# Altium footprint library Connectors.PcbLib: 56 footprints (part 2 of 4)
Each footprint in its own frame and in the unit in brackets; x right, y up, seen from the top. Pads: shape width x height; smd on the part's side, far side on the other; paste and mask are expansions set on the pad; w line width, h text height; cw(c..) or ccw(c..) is an arc to the next point about the centre after c.
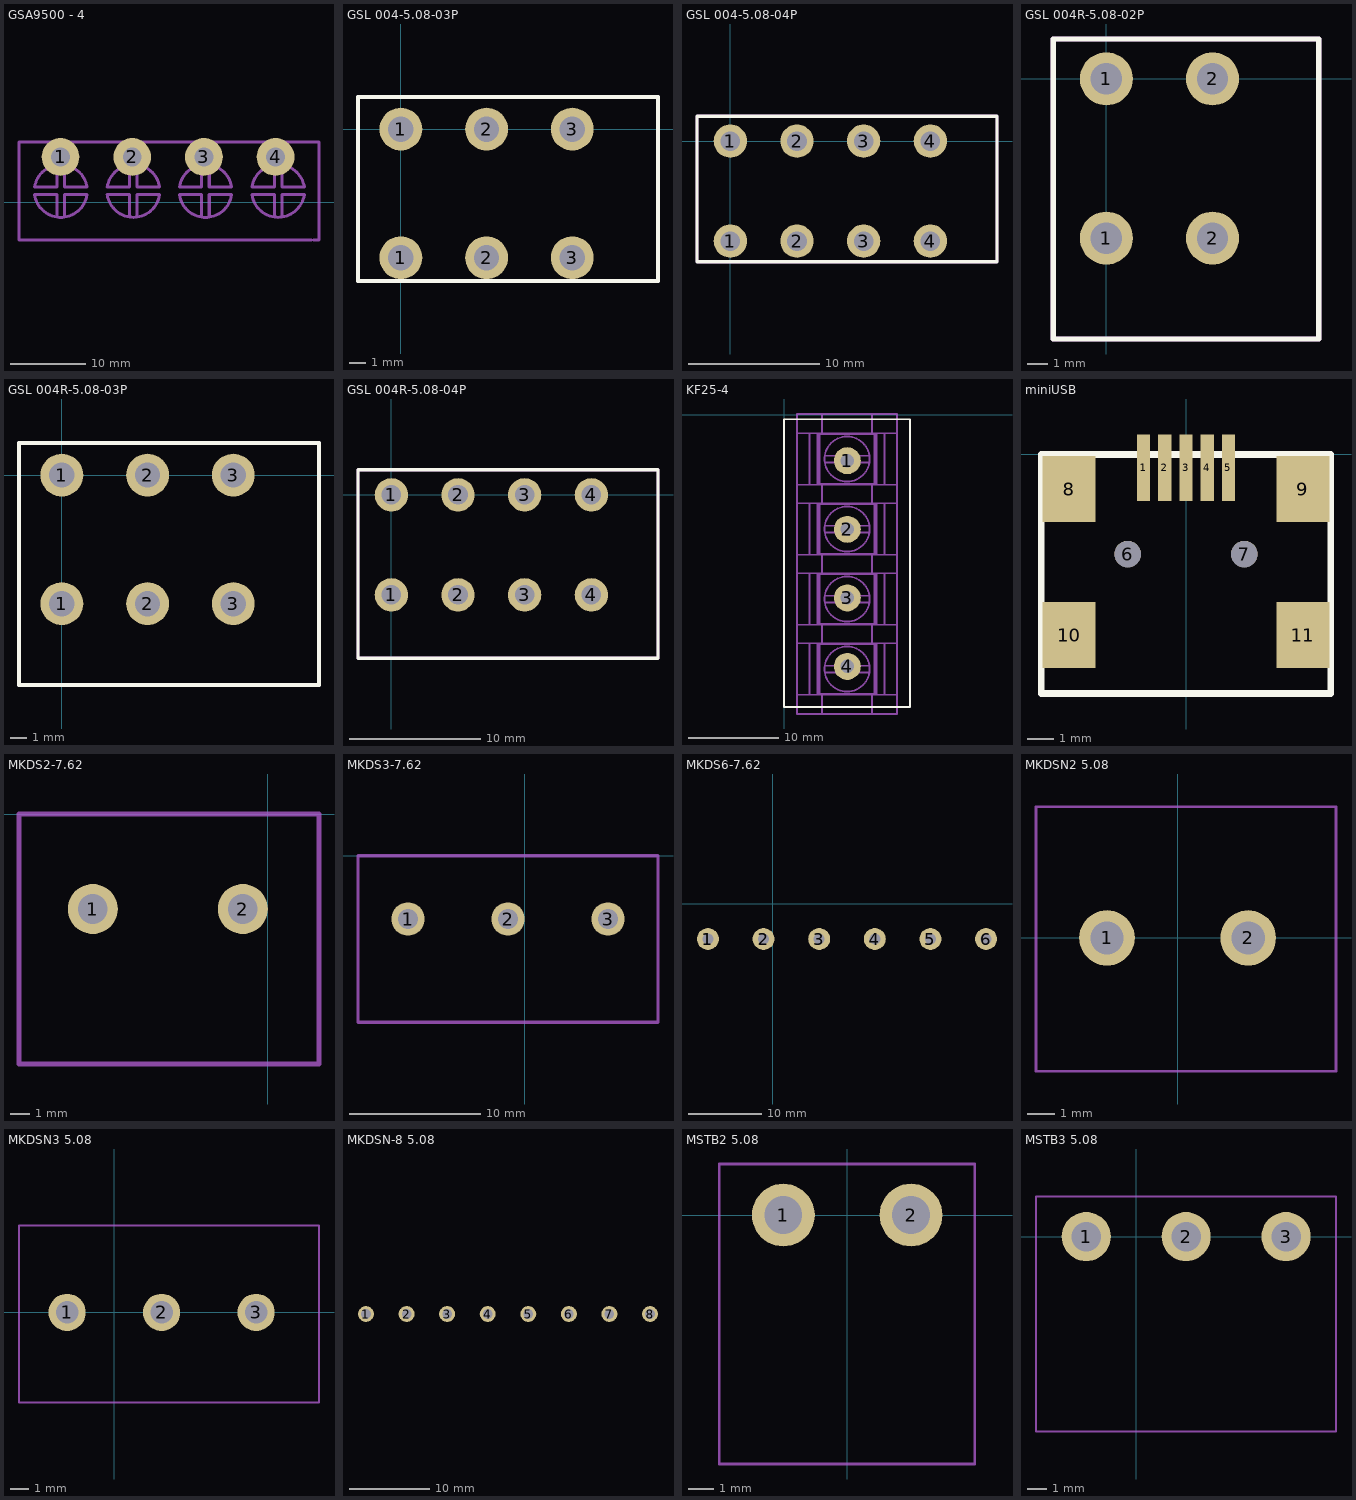
[diagram p1: the footprints below, top view; thin cyan lines are the x and y axes]

## GSA9500 - 4 [mm]
pads (4):
  round 5 hole 2.5 paste-25.4: 1(-70.5,6) 2(-61,6) 3(-51.5,6) 4(-42,6)
Mechanical 13:
  lines w0.4: -73.928,1 ccw(c-70.464,1.495) -70.97,-1.968 ccw(c-70.464,1.495) -69.97,-1.97 ccw(c-70.464,1.495) -66.999,1 ; -73.927,1 -70.97,1 -70.97,-1.966 ; -73.927,2 cw(c-70.464,1.495) -70.97,4.959 ; -73.926,2 -70.97,2 -70.97,4.957 ; -69.97,-1.968 -69.97,1 -67,1 ; -69.97,4.959 -69.97,2 -67.001,2 ; -69.97,4.96 cw(c-70.464,1.495) -67,2 ; -64.307,1 ccw(c-60.844,1.502) -61.338,-1.962 ccw(c-60.844,1.502) -60.338,-1.961 ccw(c-60.844,1.502) -57.38,1 ; -64.308,2 cw(c-60.844,1.502) -61.338,4.967 ; -64.306,1 -61.338,1 -61.338,-1.961 ; -64.307,2 -61.338,2 -61.338,4.966 ; -60.338,-1.96 -60.338,1 -57.381,1 ; -60.338,4.964 -60.338,2 -57.38,2 ; -60.338,4.966 cw(c-60.844,1.502) -57.379,2 ; -54.75,1 ccw(c-51.285,1.495) -51.792,-1.968 ccw(c-51.285,1.495) -50.792,-1.97 ; -54.749,1 -51.792,1 -51.792,-1.966 ; -54.748,2 cw(c-51.285,1.495) -51.792,4.959 ; -54.747,2 -51.792,2 -51.792,4.957 ; -50.792,-1.968 -50.792,1 -47.821,1 ; -50.792,4.959 -50.792,2 -47.823,2 ; -50.792,-1.97 ccw(c-51.285,1.495) -47.82,1 ; -50.792,4.96 cw(c-51.285,1.495) -47.822,2 ; -45.129,2 cw(c-41.665,1.502) -42.16,4.967 ; -45.129,1 ccw(c-41.665,1.502) -42.16,-1.962 ccw(c-41.665,1.502) -41.159,-1.961 ccw(c-41.665,1.502) -38.201,1 ; -45.128,2 -42.159,2 -42.159,4.966 ; -45.128,1 -42.159,1 -42.159,-1.961 ; -41.159,-1.96 -41.159,1 -38.202,1 ; -41.159,4.964 -41.159,2 -38.202,2 ; -41.159,4.966 cw(c-41.665,1.502) -38.201,2 ; -37.225,-5 -38,-5 -76,-5 -76,8 -36.25,8 -36.25,-5 -37,-5
3D body "User Library-Screw terminal block 9_5mm.SLDPRT": height 18.5, standoff -5, extent -57.275,-6 -36.225,10.5
3D body "User Library-Screw terminal block 9_5mm.SLDPRT": height 18.5, standoff -5, extent -76.275,-6 -55.225,10.5

## GSL 004-5.08-03P [mm]
pads (6):
  round 2.54 hole 1.5: 1(0,-7.62) 1(0,0) 2(5.08,-7.62) 2(5.08,0) 3(10.16,-7.62) 3(10.16,0)
Top Overlay:
  lines w0.254: -2.54,-9 15.24,-9 15.24,1.905 -2.54,1.905 -2.54,-9
Mechanical 3:
  text ".Designator" at 1.905,-4.445 h2
Mechanical 13:
  lines w0.254: -2.54,-9 -2.54,1.905 15.24,1.905 15.24,-9 -2.54,-9
3D body "70723.stp": height 14.4, standoff -3.75, extent -2.5,-9.1 15.24,4.1

## GSL 004-5.08-04P [mm]
pads (8):
  round 2.54 hole 1.5: 1(0,-7.62) 1(0,0) 2(5.08,-7.62) 2(5.08,0) 3(10.16,-7.62) 3(10.16,0) 4(15.24,-7.62) 4(15.24,0)
Top Overlay:
  lines w0.254: -2.54,-9.2 -2.54,1.905 20.32,1.905 20.32,-9.2 -2.54,-9.2
Mechanical 13:
  lines w0.254: -2.54,-9.2 20.32,-9.2 20.32,1.905 -2.54,1.905 -2.54,-9.2
3D body "70474279.stp": height 14.4, standoff -3.75, extent -2.32,-9.2 20.5,3.999

## GSL 004R-5.08-02P [mm]
pads (4):
  round 2.54 hole 1.5: 1(0,-7.62) 1(0,0) 2(5.08,-7.62) 2(5.08,0)
Top Overlay:
  lines w0.254: -2.54,-12.446 10.16,-12.446 10.16,1.905 -2.54,1.905 -2.54,-12.446
Mechanical 3:
  text ".Designator" at 1.905,-4.445 h2
Mechanical 13:
  lines w0.254: -2.54,-12.446 -2.54,1.905 10.16,1.905 10.16,-12.446 -2.54,-12.446
3D body "20020303h021b01lf.stp": height 13.21, standoff -3.5, extent -2.54,-12.455 10.12,1.787

## GSL 004R-5.08-03P [mm]
pads (6):
  round 2.54 hole 1.5: 1(0,-7.62) 1(0,0) 2(5.08,-7.62) 2(5.08,0) 3(10.16,-7.62) 3(10.16,0)
Top Overlay:
  lines w0.254: -2.54,-12.446 15.24,-12.446 15.24,1.905 -2.54,1.905 -2.54,-12.446
Mechanical 3:
  text ".Designator" at 1.905,-4.445 h2
Mechanical 13:
  lines w0.254: -2.54,-12.446 -2.54,1.905 15.24,1.905 15.24,-12.446 -2.54,-12.446
3D body "20020303h031b01lf.stp": height 13.21, standoff -3.5, extent -2.54,-12.391 15.2,1.85

## GSL 004R-5.08-04P [mm]
pads (8):
  round 2.54 hole 1.5: 1(0,-7.62) 1(0,0) 2(5.08,-7.62) 2(5.08,0) 3(10.16,-7.62) 3(10.16,0) 4(15.24,-7.62) 4(15.24,0)
Top Overlay:
  lines w0.254: -2.54,-12.446 20.32,-12.446 20.32,1.905 -2.54,1.905 -2.54,-12.446
Mechanical 3:
  text ".Designator" at 4.445,-4.318 h2
Mechanical 13:
  lines w0.254: -2.54,-12.446 -2.54,1.905 20.32,1.905 20.32,-12.446 -2.54,-12.446
3D body "20020303h041b01lf.stp": height 13.21, standoff -3.5, extent -2.52,-12.446 20.3,1.796

## KF25-4 [mm]
pads (4):
  round 3 hole 1.5: 1(7.04,-5.12) 2(7.04,-12.74) 3(7.04,-20.36) 4(7.04,-27.98)
Top Overlay:
  lines w0.2: 0,-32.5 0,-0.5 14,-0.5 14,-32.5 0,-32.5
Mechanical 3:
  text ".Designator" at -0.555,1.182 h2
Mechanical 13:
  lines w0.2: 2.848,-31.131 2.848,-25.406 ; 2.848,-23.352 2.848,-17.627 ; 2.848,-15.574 2.848,-9.848 ; 2.848,-7.795 2.848,-2.07 ; 3.737,-31.131 3.737,-25.406 ; 3.737,-23.352 3.737,-17.627 ; 3.737,-15.574 3.737,-9.848 ; 3.737,-7.795 3.737,-2.07 ; 10.28,-31.131 10.28,-25.406 ; 10.28,-23.352 10.28,-17.627 ; 10.28,-15.574 10.28,-9.848 ; 10.28,-7.795 10.28,-2.07 ; 11.169,-31.131 11.169,-25.406 ; 11.169,-23.352 11.169,-17.627 ; 11.169,-15.574 11.169,-9.848 ; 11.169,-7.795 11.169,-2.07 ; 1.453,-31.131 1.453,-33.265 4.226,-33.265 ; 1.453,-31.131 1.453,-25.406 ; 1.453,-31.131 4.226,-31.131 ; 1.453,-25.406 4.226,-25.406 ; 1.453,-25.406 1.453,-23.352 ; 1.453,-23.352 4.226,-23.352 ; 1.453,-23.352 1.453,-17.627 ; 1.453,-17.627 4.226,-17.627 ; 1.453,-17.627 1.453,-15.574 ; 1.453,-15.574 4.226,-15.574 ; 1.453,-15.574 1.453,-9.848 ; 1.453,-9.848 4.226,-9.848 ; 1.453,-9.848 1.453,-7.795 ; 1.453,-7.795 4.226,-7.795 ; 1.453,-7.795 1.453,-2.07 ; 1.453,-2.07 1.453,0.073 4.226,0.073 ; 1.453,-2.07 4.226,-2.07 ; 4.226,-33.265 4.226,-31.131 ; 4.226,-33.265 9.791,-33.265 ; 4.226,-31.131 9.791,-31.131 ; 4.226,-25.406 9.791,-25.406 ; 4.226,-25.406 4.226,-23.352 ; 4.226,-23.352 9.791,-23.352 ; 4.226,-17.627 9.791,-17.627 ; 4.226,-17.627 4.226,-15.574 ; 4.226,-15.574 9.791,-15.574 ; 4.226,-9.848 9.791,-9.848 ; 4.226,-9.848 4.226,-7.795 ; 4.226,-7.795 9.791,-7.795 ; 4.226,-2.07 4.226,0.073 ; 4.226,-2.07 9.791,-2.07 ; 4.226,0.073 9.791,0.073 ; 4.53,-28.642 ccw(c7.009,-28.269) 9.488,-28.642 ; 4.53,-28.642 cw(c7.009,-28.269) 4.502,-28.269 cw(c7.009,-28.269) 4.53,-27.895 ; 4.53,-28.642 9.488,-28.642 ; 4.53,-27.895 cw(c7.009,-28.269) 9.488,-27.895 ; 4.53,-27.895 9.488,-27.895 ; 4.53,-20.863 ccw(c7.009,-20.49) 9.488,-20.863 ; 4.53,-20.863 cw(c7.009,-20.49) 4.502,-20.49 cw(c7.009,-20.49) 4.53,-20.116 ; 4.53,-20.863 9.488,-20.863 ; 4.53,-20.116 cw(c7.009,-20.49) 9.488,-20.116 ; 4.53,-20.116 9.488,-20.116 ; 4.53,-13.084 ccw(c7.009,-12.711) 9.488,-13.084 ; 4.53,-13.084 cw(c7.009,-12.711) 4.502,-12.711 cw(c7.009,-12.711) 4.53,-12.338 ; 4.53,-13.084 9.488,-13.084 ; 4.53,-12.338 cw(c7.009,-12.711) 9.488,-12.338 ; 4.53,-12.338 9.488,-12.338 ; 4.53,-5.306 ccw(c7.009,-4.932) 9.488,-5.306 ; 4.53,-5.306 cw(c7.009,-4.932) 4.502,-4.932 cw(c7.009,-4.932) 4.53,-4.559 ; 4.53,-5.306 9.488,-5.306 ; 4.53,-4.559 cw(c7.009,-4.932) 9.488,-4.559 ; 4.53,-4.559 9.488,-4.559 ; 9.488,-28.642 ccw(c7.009,-28.269) 9.516,-28.269 ccw(c7.009,-28.269) 9.488,-27.895 ; 9.488,-20.863 ccw(c7.009,-20.49) 9.516,-20.49 ccw(c7.009,-20.49) 9.488,-20.116 ; 9.488,-13.084 ccw(c7.009,-12.711) 9.516,-12.711 ccw(c7.009,-12.711) 9.488,-12.338 ; 9.488,-5.306 ccw(c7.009,-4.932) 9.516,-4.932 ccw(c7.009,-4.932) 9.488,-4.559 ; 9.791,-33.265 12.565,-33.265 12.565,-31.131 ; 9.791,-33.265 9.791,-31.131 ; 9.791,-31.131 12.565,-31.131 ; 9.791,-25.406 12.565,-25.406 ; 9.791,-25.406 9.791,-23.352 ; 9.791,-23.352 12.565,-23.352 ; 9.791,-17.627 12.565,-17.627 ; 9.791,-17.627 9.791,-15.574 ; 9.791,-15.574 12.565,-15.574 ; 9.791,-9.848 12.565,-9.848 ; 9.791,-9.848 9.791,-7.795 ; 9.791,-7.795 12.565,-7.795 ; 9.791,-2.07 9.791,0.073 ; 9.791,-2.07 12.565,-2.07 ; 9.791,0.073 12.565,0.073 12.565,-2.07 ; 12.565,-31.131 12.565,-25.406 ; 12.565,-25.406 12.565,-23.352 ; 12.565,-23.352 12.565,-17.627 ; 12.565,-17.627 12.565,-15.574 ; 12.565,-15.574 12.565,-9.848 ; 12.565,-9.848 12.565,-7.795 ; 12.565,-7.795 12.565,-2.07 ; 3.96,-31.042 3.96,-25.495 10.058,-25.495 10.058,-31.042 3.96,-31.042 ; 3.96,-23.264 3.96,-17.716 10.058,-17.716 10.058,-23.264 3.96,-23.264 ; 3.96,-15.485 3.96,-9.937 10.058,-9.937 10.058,-15.485 3.96,-15.485 ; 3.96,-7.706 3.96,-2.159 10.058,-2.159 10.058,-7.706 3.96,-7.706 ; 6.467,-28.557 6.467,-27.98 7.533,-27.98 7.533,-28.557 6.467,-28.557 ; 6.467,-20.779 6.467,-20.201 7.533,-20.201 7.533,-20.779 6.467,-20.779 ; 6.467,-13 6.467,-12.422 7.533,-12.422 7.533,-13 6.467,-13 ; 6.467,-5.221 6.467,-4.643 7.533,-4.643 7.533,-5.221 6.467,-5.221
3D body "1-796658-9.stp": height 14.48, standoff -4.06, extent 0.3,-33.835 13,0.835

## miniUSB [mm]
pads (11):
  rect 0.5x2.5 smd: 1(-1.6,-0.5) 2(-0.8,-0.5) 3(0,-0.5) 4(0.8,-0.5) 5(1.6,-0.5)
  round 1 hole 1: 6(-2.2,-3.75) 7(2.2,-3.75)
  rect 2x2.5 smd: 8(-4.4,-1.3) 9(4.4,-1.3) 10(-4.4,-6.8) 11(4.4,-6.8)
Top Overlay:
  lines w0.01: -5.45,-3.75 -5.45,0 0,0 ; 5.45,-5.5 5.45,-5.4
  lines w0.25: -5.45,0 5.45,0
  lines w0.254: -5.45,0 -5.45,-9 5.45,-9 5.45,0 ; 5.45,-3.8 5.45,-3.75 ; 0,-9 0,-9

## MKDS2-7.62 [mm]
pads (2):
  round 2.54 hole 1.5: 1(-8.89,-4.826) 2(-1.27,-4.826)
Mechanical 13:
  lines w0.254: -12.64,-12.7 -12.64,0 2.6,0 2.6,-12.7 -12.64,-12.7
3D body "38228.stp": height 21.5, standoff -5, extent -13.239,-12.7 2.571,-0.2

## MKDS3-7.62 [mm]
pads (3):
  round 2.54 hole 1.5: 1(-8.89,-4.826) 2(-1.27,-4.826) 3(6.35,-4.826)
Mechanical 13:
  lines w0.254: -12.7,-12.7 10.16,-12.7 10.16,0 -12.7,0 -12.7,-12.7
3D body "37707.stp": height 21.5, standoff -5, extent -13.239,-12.7 10.191,-0.2

## MKDS6-7.62 [mm]
pads (6):
  round 3 hole 1.5: 1(-8.89,-4.826) 2(-1.27,-4.826) 3(6.35,-4.826) 4(13.97,-4.826) 5(21.59,-4.826) 6(29.21,-4.826)
3D body "37707.stp": height 21.5, standoff -5, extent -13.239,-12.7 10.191,-0.2
3D body "37707.stp": height 21.5, standoff -5, extent 9.621,-12.7 33.051,-0.2

## MKDSN2 5.08 [mm]
pads (2):
  round 2 hole 1.2: 1(-2.54,0) 2(2.54,0)
Mechanical 3:
  text ".Designator" at -4.055,-3.318 h2
Mechanical 13:
  lines w0.1: -5.095,-4.8 -5.095,-3.276 -5.095,4.725 5.7,4.725 5.7,-4.8 -5.095,-4.8
3D body "38261.stp": height 15, standoff -3.5, extent -5.111,-4.801 5.619,4.699

## MKDSN3 5.08 [mm]
pads (3):
  round 2 hole 1.2: 1(-2.54,0) 2(2.54,0) 3(7.62,0)
Mechanical 3:
  text ".Designator" at -1.555,-2.818 h2
Mechanical 13:
  lines w0.1: -5.126,-4.851 11,-4.851 11,4.674 -5.126,4.674 -5.126,-3.327 -5.126,-4.851
3D body "38261.stp": height 15, standoff -3.5, extent -5.111,-4.801 5.619,4.699
3D body "38261.stp": height 15, standoff -3.5, extent -0.031,-4.801 10.699,4.699

## MKDSN-8 5.08 [mm]
pads (8):
  round 2 hole 1.2: 1(-1254.76,-1239.52) 2(-1249.68,-1239.52) 3(-1244.6,-1239.52) 4(-1239.52,-1239.52) 5(-1234.44,-1239.52) 6(-1229.36,-1239.52) 7(-1224.28,-1239.52) 8(-1219.2,-1239.52)
3D body "17433.stp": height 10, standoff -3.5, extent -1257.204,-1243.584 -1215.994,-1235.484

## MSTB2 5.08 [mm]
pads (2):
  round 2.5 hole 1.5: 1(-2.54,0) 2(2.54,0)
Mechanical 3:
  text ".Designator" at -4.055,-3.318 h2
Mechanical 13:
  lines w0.1: -5.095,-9.906 5.08,-9.906 5.08,2.032 -5.095,2.032 -5.095,-3.276 -5.095,-9.906
3D body "1759017.stp": height 8.6, standoff -3.5, extent -5.08,-9.938 5.08,2.064

## MSTB3 5.08 [mm]
pads (3):
  round 2.5 hole 1.5: 1(-2.54,0) 2(2.54,0) 3(7.62,0)
Mechanical 3:
  text ".Designator" at -4.055,-3.318 h2
Mechanical 13:
  lines w0.1: -5.095,-9.906 -5.095,-3.276 -5.095,2.032 10.16,2.032 10.16,-9.906 -5.095,-9.906
3D body "1759020.stp": height 8.6, standoff -3.5, extent -5.08,-9.938 10.16,2.064